# Altium integrated library CMR_Miscellaneous_Devices.IntLib: 110 symbols
Pins are listed as number, name and electrical type; pins without a type are passive.

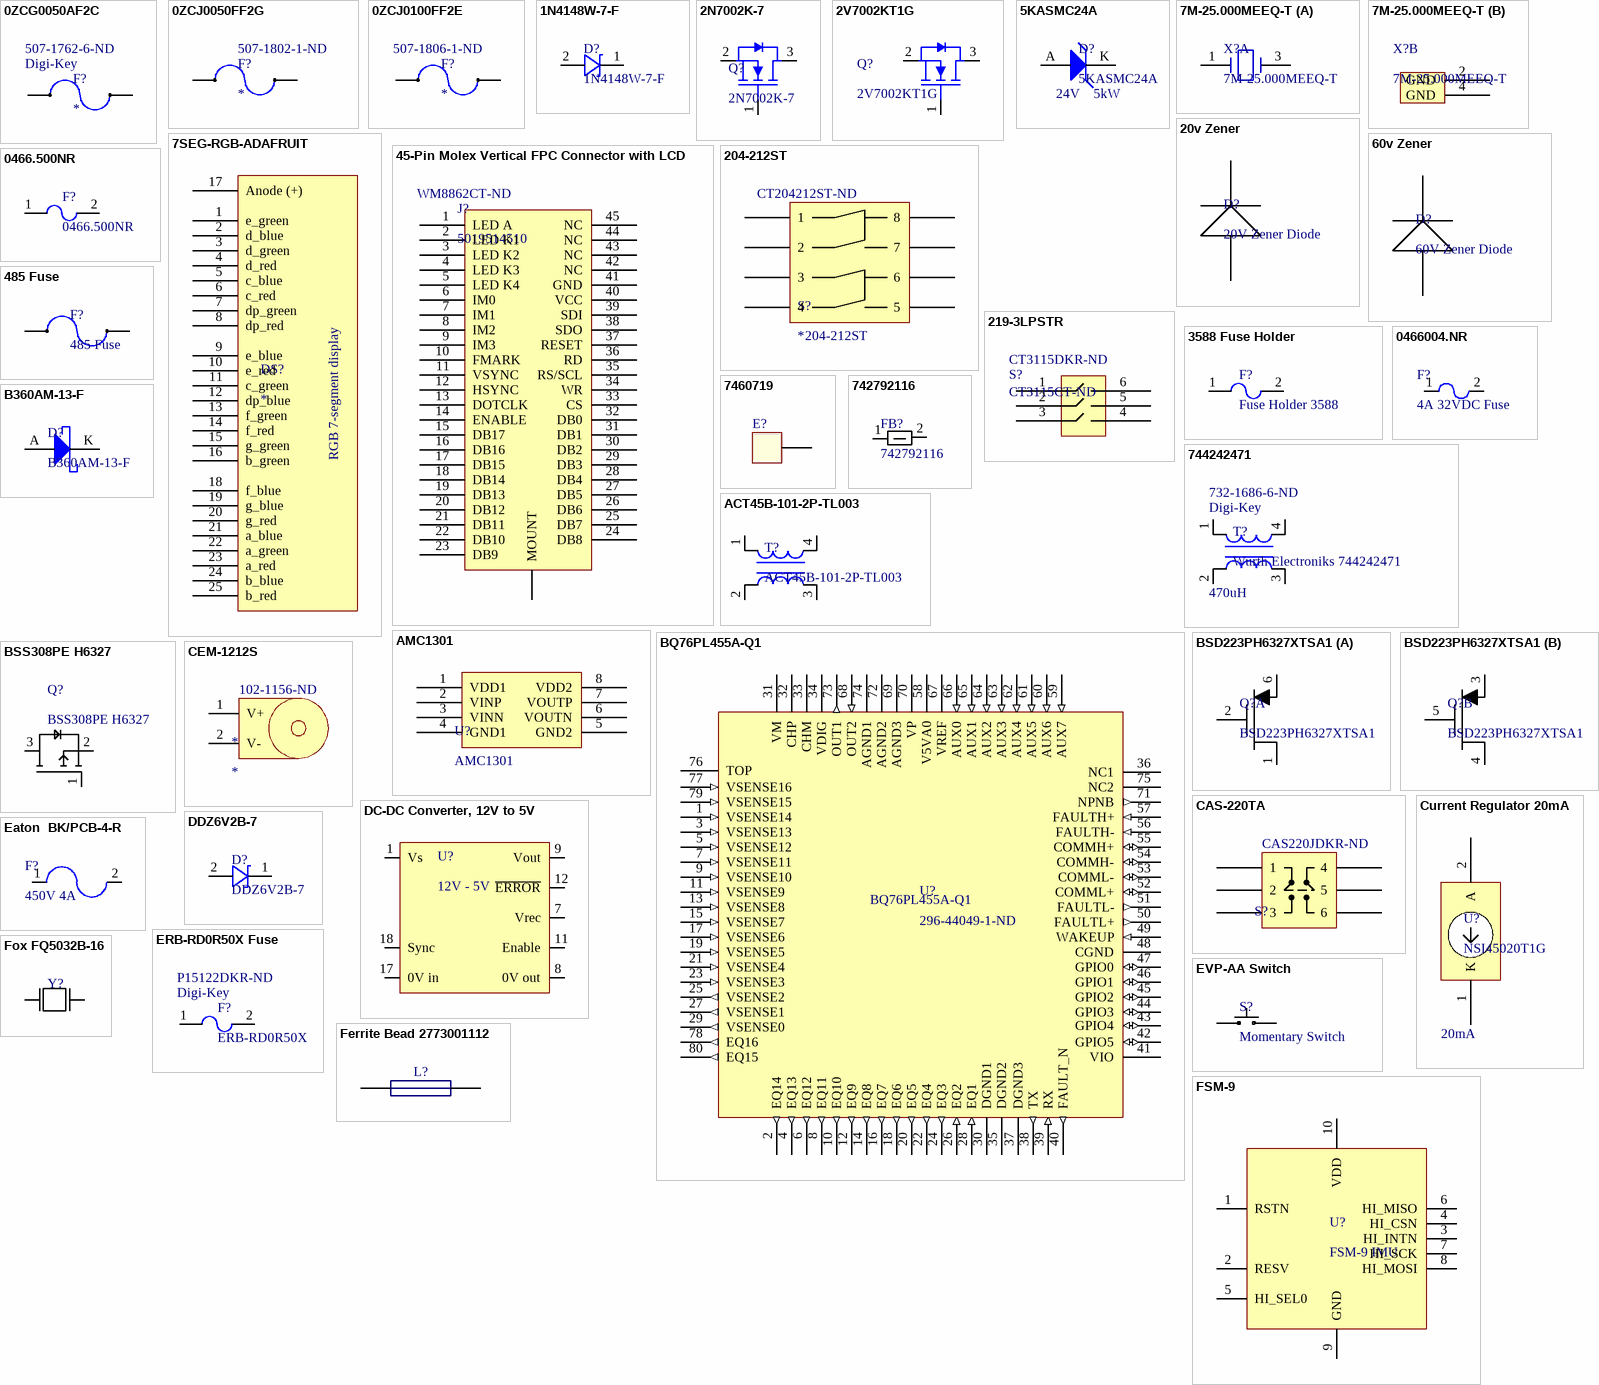
[diagram p0: symbols 0ZCG0050AF2C to FSM-9]

## 0ZCG0050AF2C
designator F?  Supplier 1: Digi-Key  Supplier Part Number 1: 507-1762-6-ND
PTC RESET FUSE 30V 500MA 1812; ComponentLink1Description: Digikey Link; ComponentLink1URL: https://www.digikey.com/product-detail/en/bel-fuse-inc/0ZCG0050AF2C/507-1762-1-ND/4156148
footprint 1812 Resistor Package
pins: 1, 2

## 0ZCJ0050FF2G
designator F?  Supplier Part Number 1: 507-1802-1-ND
PTC RESTTBLE 0.50A 8V CHIP 1206; Supplier 1: Digi-Key
footprint FUSE 3217X06N (PTC Resettable Fuse 8V Ih Surface Mount 1206 (3216 Metric), Concave)
pins: 1, 2

## 0ZCJ0100FF2E
designator F?  Supplier Part Number 1: 507-1806-1-ND
PTC RESTTBLE 1.0A 6V CHIP 1206; Supplier 1: Digi-Key
footprint FUSE 3217X06N (PTC Resettable Fuse 8V Ih Surface Mount 1206 (3216 Metric), Concave)
pins: 1, 2

## 1N4148W-7-F
designator D?
DIODE GEN PURP 100V 300MA SOD123; Supplier: DigiKey; Part Number: 1N4148W-7-F; Supplier Part Number: 1N4148W-FDICT-ND; Datasheet URL: https://www.diodes.com/assets/Datasheets/ds30086.pdf
footprint 1N4148W-7-F
pins: 1 NPNB, 2 NPNB

## 2N7002K-7
designator Q?
MOSFET N-CH 60V 0.38A SOT23-3; Supplier: Digikey; Part Number: 2N7002K-7; Supplier Part Number: 2N7002K-7DICT-ND; Datasheet URL: https://www.diodes.com/assets/Datasheets/ds30896.pdf
footprint 2N7002K-7 (MOSFET N-CH 60V 0.38A SOT23-3)
pins: 1, 2, 3

## 2V7002KT1G
designator Q?
MOSFET N-CH 60V 320MA SOT-23-3; Supplier: DigiKey; Supplier Part Number: 2V7002KT1GOSCT-ND; Part Number: 2V7002KT1G; Datasheet URL: www.mouser.com/ds/2/308/2N7002K-D-40616.pdf
footprint 2V7002KT1G
pins: 1, 2, 3

## 5KASMC24A
designator D?  Power - Peak Pulse: 5kW  Reverse Standoff Voltage: 24V
TVS Diode, Vbr~=28V, 5000W; Supplier 1: Digi-Key; Supplier Part Number 1: 5KASMC24AHM3/57GICT-ND; Datasheet: http://www.vishay.com/docs/89432/5kasmc.pdf
footprint 5KASMC24A
pins: A, K

## 7M-25.000MEEQ-T
designator X?
CRYSTAL 25.0000MHZ 10PF SMD; Manufacturer 1: TXC; Frequency: 25MHz; Frequency Tolerance: 10ppm; ESR (Equivalent Series Resistance): 60R; Supplier 1: Digi-Key; Supplier Part Number 1: 887-1326-1-ND; Manufacturer Part Number 1: 7M-25.000MEEQ-T; Stock 1: 17097; Pricing 1: 1=1.27, 10=1.209, 50=1.1812, 100=1.0125, 500=0.9844, 1000=0.8297 (USD); Mount: Surface Mount; Case/Package: SMD/SMT; Number of Pins: 4; Min Operating Temperature: -20°C; Max Operating Temperature: 70°C; Load Capacitance: 10pF; Packaging: Tape and Reel; Package Quantity: 3000; Tolerance: 10ppm; Frequency Stability: 10ppm; Termination: SMD/SMT; Length: 3.2mm; Height: 0.031inch; Width: 0.098inch; Depth: 2.5mm; REACH SVHC: No SVHC; ComponentLink1URL: https://datasheet.ciiva.com/26918/getdatasheetpartid-757227-26918816.pdf; ComponentLink1Description: https://datasheet.ciiva.com/26918/getdatasheetpartid-757227-26918816.pdf; ComponentLink2URL: https://datasheet.ciiva.com/856/7m-accuracy-856022.pdf; ComponentLink2Description: https://datasheet.ciiva.com/856/7m-accuracy-856022.pdf; ComponentLink3URL: https://datasheet.ciiva.com/22658/1794111-22658486.pdf; ComponentLink3Description: https://datasheet.ciiva.com/22658/1794111-22658486.pdf; ComponentLink4URL: https://datasheet.ciiva.com/856/7m-accuracy-856023.pdf; ComponentLink4Description: https://datasheet.ciiva.com/856/7m-accuracy-856023.pdf; ComponentLink5URL: https://datasheet.ciiva.com/856/7m-accuracy-856024.pdf; ComponentLink5Description: https://datasheet.ciiva.com/856/7m-accuracy-856024.pdf; ComponentLink6URL: https://datasheet.ciiva.com/4946/7m-11184-4946126.pdf; ComponentLink6Description: https://datasheet.ciiva.com/4946/7m-11184-4946126.pdf; ComponentLink7URL: https://datasheet.ciiva.com/28498/1794111-28498878.pdf; ComponentLink7Description: https://datasheet.ciiva.com/28498/1794111-28498878.pdf
footprint OSCSC320X250X100N
part A pins: 1 11, 3
part B pins: 2 GND, 4 GND

## 7SEG-RGB-ADAFRUIT
designator DS?
footprint 7SEG-RGB-ADAFRUIT
pins: 1 e_green, 2 d_blue, 3 d_green, 4 d_red, 5 c_blue, 6 c_red, 7 dp_green, 8 dp_red, 9 e_blue, 10 e_red, 11 c_green, 12 dp_blue, 13 f_green, 14 f_red, 15 g_green, 16 b_green, 17 Anode (+), 18 f_blue, 19 g_blue, 20 g_red, 21 a_blue, 22 a_green, 23 a_red, 24 b_blue, 25 b_red
text: RGB 7-segment display

## 20v Zener
designator D?, comment 20V Zener Diode
footprint UDZS20B (20v Zener)
pins: 1, 2

## 45-Pin Molex Vertical FPC Connector with LCD
designator J?, comment 5019514510  Supplier Part Number 1: WM8862CT-ND
45 pin Molex, 0.50mm pitch, with LCD Display; Manufacturer Part Number: 0541044531; LCD Manufacturer: Displaytech; LCD Manufacturer Part Number: DT028ATFT; Manufacturer: Molex; Datasheet: http://www.molex.com/pdm_docs/sd/541044631_sd.pdf; LCD Datasheet: http://www.mouser.com/ds/2/116/DT028ATFT-v21-221378.pdf; Supplier 1: Digi-Key
footprint LCD Display with FPC Connector (2.8" Displaytech DT028ATFT LCD Display with Molex 0541044531 Right Angle 45-pin FPC Connector)
pins: 0 MOUNT, 1 LED A, 2 LED K1, 3 LED K2, 4 LED K3, 5 LED K4, 6 IM0, 7 IM1, 8 IM2, 9 IM3, 10 FMARK, 11 VSYNC, 12 HSYNC, 13 DOTCLK, 14 ENABLE, 15 DB17, 16 DB16, 17 DB15, 18 DB14, 19 DB13, 20 DB12, 21 DB11, 22 DB10, 23 DB9, 24 DB8, 25 DB7, 26 DB6, 27 DB5, 28 DB4, 29 DB3, 30 DB2, 31 DB1, 32 DB0, 33 CS, 34 WR, 35 RS/SCL, 36 RD, 37 RESET, 38 SDO, 39 SDI, 40 VCC, 41 GND, 42 NC, 43 NC, 44 NC, 45 NC

## 60v Zener
designator D?, comment 60V Zener Diode
footprint MMSZ5264BT1G (60v Zener)
pins: 1, 2

## 204-212ST
designator S?  Supplier Part Number 1: CT204212ST-ND
SWITCH SLIDE DIP DPST 50MA 24V; Supplier 1: Digi-Key
footprint 204-212ST  2 POS DPST (Dip Switch DPST 2 Position Surface Mount Slide (Standard) Actuator 50mA 24VDC)
pins: 1, 2, 3, 4, 5, 6, 7, 8

## 219-3LPSTR
designator S?, comment CT3115CT-ND  Supplier Part Number 1: CT3115DKR-ND
SWITCH SLIDE DIP SPST 100MA 20V; Supplier 1: Digi-Key
footprint 219-3LPSTR (SWITCH SLIDE DIP SPST 100MA 20V)
pins: 1, 2, 3, 4, 5, 6

## 0466.500NR
designator F?
FUSE BOARD MOUNT 500MA 63VAC/VDC; Supplier: DigiKey; Part Number: 0466.500NR; Supplier Part Number: F1454CT-ND; Datasheet URL: http://www.littelfuse.com/~/media/electronics/datasheets/fuses/littelfuse_fuse_466_datasheet.pdf.pdf
footprint 0466.500NR (, 2-Leads, Body 3.18x1.52mm, IPC Medium Density)
pins: 1, 2

## 485 Fuse
designator F?
485 Series Fast-Blow Fuse; Part Number: 0485001.DR; Voltage Rating: 600V; Current Rating: 1A; Datasheet: http://www.littelfuse.com/~/media/electronics/datasheets/fuses/littelfuse_fuse_485_datasheet.pdf.pdf; Package: 2-SMD
footprint 485 Fuse (485 Series Fast-Blow Fuse)
pins: 1, 2

## 3588 Fuse Holder
designator F?, comment Fuse Holder 3588
Keystone Electronics 3588; Supplier 1: Digi-Key; Supplier Part Number 1: 36-3588-ND; Datasheet: http://keyelco.com/userAssets/file/M65p43.pdf
footprint Fuse Holder 3588 (Keystone Electronics 3588 Automotive Blade Fuse Holder, SMT)
pins: 1, 2

## 0466004.NR
designator F?, comment 4A 32VDC Fuse
FUSE BOARD MNT 4A 32VAC/VDC 1206; ComponentLink1Description: Digikey; ComponentLink1URL: https://www.digikey.com/product-detail/en/littelfuse-inc/0466004.NR/F1459CT-ND/521357
footprint CAF-127P152X317-2N (Chip Array, Flat, 2-Leads, Pitch 1.27mm,  Body 1.52x3.18mm,  IPC Medium Density)
pins: 1, 2

## 7460719
designator E?
REDCUBE PRESS-FIT with external thread, full plain WP-SHFU, M8, 13 mm; Part Number: 7460719; Pin Number: 25; Rated Current: 250 A; Thread Length: 13 mm; ComponentLink1Description: Manufacturer; ComponentLink1URL: http://www.we-online.de; ComponentLink2Description: Datasheet; ComponentLink2URL: http://katalog.we-online.de/em/datasheet/7460719.pdf; Published Date: Feb. 2017; Publisher: Wurth Elektronik; Thread: M8
footprint 7460719 (M8, thread 13mm)
pins: 1

## 742792116
designator FB?
FERRITE BEAD 500 OHM 1206 1LN; Datasheet URL: media.digikey.com/PDF/Data Sheets/Wurth Electronics PDFs/742792116.pdf; Supplier: DigiKey; Supplier Part Number: 732-4652-1-ND; Part Number: 742792116
footprint 742792116 (, 2-Leads, Body 3.20x1.60mm, IPC Medium Density)
pins: 1, 2

## 744242471
designator T?, comment Wurth Electroniks 744242471  Inductance: 470uH  Supplier 1: Digi-Key  Supplier Part Number 1: 732-1686-6-ND
470µH @ 100kHz 2 Line Common Mode Choke Surface Mount 2.2 kOhms @ 15MHz 400mA DCR 350 mOhm; ComponentLink1Description: Digikey Link; ComponentLink1URL: https://www.digikey.com/product-detail/en/wurth-electronics-inc/744242471/732-1686-1-ND/1994266; ComponentLink2Description: Datasheet Link; ComponentLink2URL: https://katalog.we-online.de/pbs/datasheet/744242471.pdf
footprint Wurth 744242471
pins: 1, 2, 3, 4

## ACT45B-101-2P-TL003
designator T?
Common Mode Chokes / Filters 5000ohms 100uH 150mA CAN-BUS AEC-Q200; Supplier: DigiKey; Supplier Part Number: 445-3959-1-ND; Part Number: ACT45B-101-2P-TL003; Datasheet URL: www.mouser.com/ds/2/400/e9711_act-469477.pdf
footprint ACT45B-101-2P-TL003 (DFN, 4-Leads, Body 3.20x4.50mm, Pitch 4.55mm, IPC Medium Density)
pins: 1, 2, 3, 4

## AMC1301
designator U?
IC AMP ISOLATION 250MV 8SOIC; Supplier 1: Digi-Key; Supplier Part Number 1: 296-44577-2-ND
footprint SOIC127P1150X280-8N (SOIC, 8-Leads, Body 5.85x7.50mm, Pitch 1.27mm, IPC Medium Density)
pins: 1 VDD1, 2 VINP, 3 VINN, 4 GND1, 5 GND2, 6 VOUTN, 7 VOUTP, 8 VDD2

## B360AM-13-F
designator D?
Schottky Diode B360AM-13-F; Datasheet: http://diodes.com/_files/datasheets/B360AM.pdf; Supplier 1: Digi-Key; Supplier Part Number 1: B360AM-13-FDICT-ND
footprint B360AM-13-F
pins: A, K

## BQ76PL455A-Q1
designator U?, comment 296-44049-1-ND
IC BATT MONITOR/PROTECT 80TQFP; Part Number: BQ76PL455ATPFCRQ1; Supplier: DigiKey; Datasheet URL: http://www.ti.com/lit/ds/symlink/bq76pl455a-q1.pdf; Design Recommendations: http://www.ti.com/lit/an/slua791/slua791.pdf; Supplier Part Number: 6-44049-1-ND
footprint BQ76PL455A-Q1 (TSQFP, 80-Leads, Body 12.00x12.00mm, Pitch 0.50mm, IPC Medium Density)
pins: 1 VSENSE14 (in), 2 EQ14 (out), 3 VSENSE13 (in), 4 EQ13 (out), 5 VSENSE12 (in), 6 EQ12 (out), 7 VSENSE11 (in), 8 EQ11 (out), 9 VSENSE10 (in), 10 EQ10 (out), 11 VSENSE9 (in), 12 EQ9 (out), 13 VSENSE8 (in), 14 EQ8 (out), 15 VSENSE7 (in), 16 EQ7 (out), 17 VSENSE6 (in), 18 EQ6 (out), 19 VSENSE5 (in), 20 EQ5 (out), 21 VSENSE4 (in), 22 EQ4 (out), 23 VSENSE3 (in), 24 EQ3 (out), 25 VSENSE2 (out), 26 EQ2 (in), 27 VSENSE1 (out), 28 EQ1 (in), 29 VSENSE0 (out), 30 DGND1 (power), 31 VM (power), 32 CHP (power), 33 CHM (power), 34 VDIG (power), 35 DGND2 (power), 36 NC1, 37 DGND3 (power), 38 TX (out), 39 RX (in), 40 FAULT_N (out), 41 VIO (power), 42 GPIO5 (io), 43 GPIO4 (io), 44 GPIO3 (io), 45 GPIO2 (io), 46 GPIO1 (io), 47 GPIO0 (io), 48 CGND (power), 49 WAKEUP (in), 50 FAULTL+ (out), 51 FAULTL- (out), 52 COMML+ (io), 53 COMML- (io), 54 COMMH- (io), 55 COMMH+ (io), 56 FAULTH- (in), 57 FAULTH+ (in), 58 V5VA0 (power), 59 AUX7 (in), 60 AUX6 (in), 61 AUX5 (in), 62 AUX4 (in), 63 AUX3 (in), 64 AUX2 (in), 65 AUX1 (in), 66 AUX0 (in), 67 VREF (power), 68 OUT2 (in), 69 AGND3 (power), 70 VP (power), 71 NPNB (out), 72 AGND2 (power), 73 OUT1 (out), 74 AGND1 (power), 75 NC2, 76 TOP (power), 77 VSENSE16 (in), 78 EQ16 (out), 79 VSENSE15 (in), 80 EQ15 (out)

## BSD223PH6327XTSA1
designator Q?
dual p-channel mosfet; Manufacturer 1: Infineon; Drain to Source Voltage (Vdss): -20V; Continuous Drain Current (ID): 390mA; Rds On Max: 1.2R; Input Capacitance: 56pF; Max Power Dissipation: 250mW; Turn-On Delay Time: 3.8ns; Rise Time: 5ns; Turn-Off Delay Time: 5.1ns; Gate to Source Voltage (Vgs): 12V; Supplier 1: Digi-Key; Supplier Part Number 1: BSD223PH6327XTSA1CT-ND; Manufacturer Part Number 1: BSD223PH6327XTSA1; Stock 1: 77806; Pricing 1: 1=0.56, 10=0.398, 100=0.2615, 500=0.1545, 1000=0.1189 (USD); Mount: Surface Mount; Case/Package: SOT-363; Number of Pins: 6; Min Operating Temperature: -55°C; Max Operating Temperature: 150°C; Packaging: Tape and Reel; Drain to Source Resistance: 1.2R; Max Dual Supply Voltage: -20V; Length: 2mm; Height: 0.8mm; Width: 1.25mm; Lead Free: Lead Free; Halogen Free: Halogen Free; ComponentLink1URL: http://www.farnell.com/datasheets/2211530.pdf; ComponentLink1Description: http://www.farnell.com/datasheets/2211530.pdf; ComponentLink2URL: http://components.arrow.com/part/dataview/53770121S151981N2051; ComponentLink2Description: http://components.arrow.com/part/dataview/53770121S151981N2051; ComponentLink3URL: https://www.infineon.com/dgdl/BSD223P_Rev1.5.pdf?folderId=db3a304314dca38901154a72e3951a65&fileId=db3a30433580b37101358619d0af33b9; ComponentLink3Description: https://www.infineon.com/dgdl/BSD223P_Rev1.5.pdf?folderId=db3a304314dca38901154a72e3951a65&fileId=db3a30433580b37101358619d0af33b9; ComponentLink4URL: http://www.infineon.com/dgdl/Infineon-BSD223P-DS-v01_06-EN.pdf?fileId=5546d4624b0b249c014b3607ad2610c8; ComponentLink4Description: http://www.infineon.com/dgdl/Infineon-BSD223P-DS-v01_06-EN.pdf?fileId=5546d4624b0b249c014b3607ad2610c8; ComponentLink5URL: http://www.infineon.com/dgdl/BSD223P_Rev1.5.pdf?folderId=db3a304314dca38901154a72e3951a65&fileId=db3a30433580b37101358619d0af33b9; ComponentLink5Description: http://www.infineon.com/dgdl/BSD223P_Rev1.5.pdf?folderId=db3a304314dca38901154a72e3951a65&fileId=db3a30433580b37101358619d0af33b9
footprint PG-SOT-363 (SOT23, 6-Leads, Body 2.00x2.15mm, Pitch 0.65mm, IPC Medium Density)
part A pins: 1, 2, 6
part B pins: 3, 4, 5

## BSS308PE H6327
designator Q?
MOSFET P-Ch -30V -2A SOT-23-3; Supplier: Mouser; Part Number: BSS308PE H6327; Supplier Part Number: 726-BSS308PEH6327; Datasheet URL: http://www.mouser.com/ds/2/196/BSS308PE_Rev2.03_-88579.pdf
pins: 1, 2, 3

## CAS-220TA
designator S?  Supplier Part Number 1: CAS220JDKR-ND  (hidden comment: *)
SWITCH SLIDE DPDT 100MA 6V; Supplier 1: Digi-Key
footprint CAS-220
pins: 1, 2, 3, 4, 5, 6

## CEM-1212S
designator *  Supplier Part Number 1: 102-1156-ND
AUDIO MAGNETIC XDCR 6-16V TH; Manufacturer: CUI Inc.; Manufacturer Part Number: CEM-1212S; Driver Circuitry: Transducer, Externally Driven; Input Type: Zero-Peak Signal; Voltage - Rated: 12V; Voltage Range: 6 ~ 16V; Frequency: 2.4kHz; Operating Mode: Single Tone; Sound Pressure Level: 85dB @ 12V, 10cm; Current - Supply: 40mA; Port Location: Top; Ratings: Washable; Supplier 1: Digi-Key; RoHS: RoHS Compliant; Category: Audio Products; Stock 1: 21467; Pricing 1: 1=1.31, 10=1.018, 100=0.7763, 500=0.621, 1000=0.552, 2500=0.45885 (USD); Packaging: Bulk; Part Status: Active; Technology: Magnetic; Duration: -; Operating Temperature: -20°C ~ 60°C; Approvals: -; Mounting Type: Through Hole; Termination: PC Pins; Size / Dimension: 12.0mm Dia x 10.0mm H; Height - Seated (Max): *; ComponentLink1URL: http://www.cui.com/product/resource/digikeypdf/cem-1212s.pdf; ComponentLink1Description: http://www.cui.com/product/resource/digikeypdf/cem-1212s.pdf
footprint CEM-1212S
pins: 1 V+, 2 V-

## Current Regulator 20mA
designator U?, comment NSI45020T1G  Current: 20mA
20mA Current regulator SOD-123. 208mW; Manufacturer: ON Semiconductor; Supplier 1: Digi-Key; Supplier Part Number 1: NSI45020T1GOSTR-ND; Manufacturer Part Number: NSI45020T1G; Datasheet: http://www.onsemi.com/pub_link/Collateral/NSI45020-D.PDF
footprint NSI45020 (SOD-123 Package Constant Current Regulator, 20mA)
pins: 1 K, 2 A

## DC-DC Converter, 12V to 5V
designator U?, comment 12V - 5V
DigiKey 296-9458-5-ND
footprint NVE (R-PDIP-T10/18)
pins: 1 Vs, 7 Vrec, 8 0V out, 9 Vout, 11 Enable, 12 ~{ERROR}, 17 0V in, 18 Sync

## DDZ6V2B-7
designator D?
DIODE ZENER 6.2V 500MW SOD123; Supplier: DigiKey; Part Number: DDZ6V2B-7; Datasheet URL: https://www.diodes.com/assets/Datasheets/ds30407.pdf; Supplier Part Number: DDZ6V2BDICT-ND
footprint DDZ6V2B-7
pins: 1 NPNB, 2 NPNB

## Eaton  BK/PCB-4-R
designator F?, comment 450V 4A
450V 4A 2.5kA Breaking; ComponentLink1Description: digikey; ComponentLink1URL: https://www.digikey.com/product-detail/en/littelfuse-inc/0456040.DR/F3364CT-ND/2080265
footprint BK/PCB-4-R
pins: 1, 2

## ERB-RD0R50X Fuse
designator F?, comment ERB-RD0R50X  Supplier 1: Digi-Key  Supplier Part Number 1: P15122DKR-ND
FUSE BOARD MNT 500MA 32VDC 0402; ComponentLink1Description: Digikey Link; ComponentLink1URL: https://www.digikey.com/product-detail/en/panasonic-electronic-components/ERB-RD0R50X/P15122CT-ND/2796798; ComponentLink2Description: Datasheet Link; ComponentLink2URL: https://industrial.panasonic.com/cdbs/www-data/pdf/AFA0000/AFA0000C7.pdf
footprint 0402 Fuse
pins: 1, 2

## EVP-AA Switch
designator S?, comment Momentary Switch
EVP-AA Momentary Switch SPST-NO; Part Number: EVP-AA202K; Supplier 1: Digi-Key; Supplier Part Number 1: P13348SCT-ND; Datasheet: http://industrial.panasonic.com/lecs/www-data/pdf/ATK0000/ATK0000CE26.pdf
footprint EVP-AA202K (Momentary Switch SMT SPST-NO EVP-AA series)
pins: 1, 2

## Ferrite Bead 2773001112
designator L?  (value not drawn)
73 Material Fair-rite ferrite bead; Part #: 2773001112; Manufacturer: Fair-rite
footprint Fair-rite 2773001112 (2773001112 Ferrite Bead)
pins: 1, 2

## Fox FQ5032B-16
designator Y?
16MHz Crystal
footprint FQ 5032B
pins: 1, 3

## FSM-9
designator U?, comment FSM-9 IMU
Hillcrest Labs FSM-9 9-axis IMU and AHRS; Supplier 1: Hillcrest Labs; Supplier Part Number 1: FSM-9; Datasheet: http://hillcrestlabs.com/download/2416/; Created By: semerson
footprint FSM-9 (Hillcrest Labs FSM-9 9-axis IMU/AHRS)
pins: 1 RSTN, 2 RESV, 3 HI_INTN, 4 HI_CSN, 5 HI_SEL0, 6 HI_MISO, 7 HI_SCK, 8 HI_MOSI, 9 GND, 10 VDD

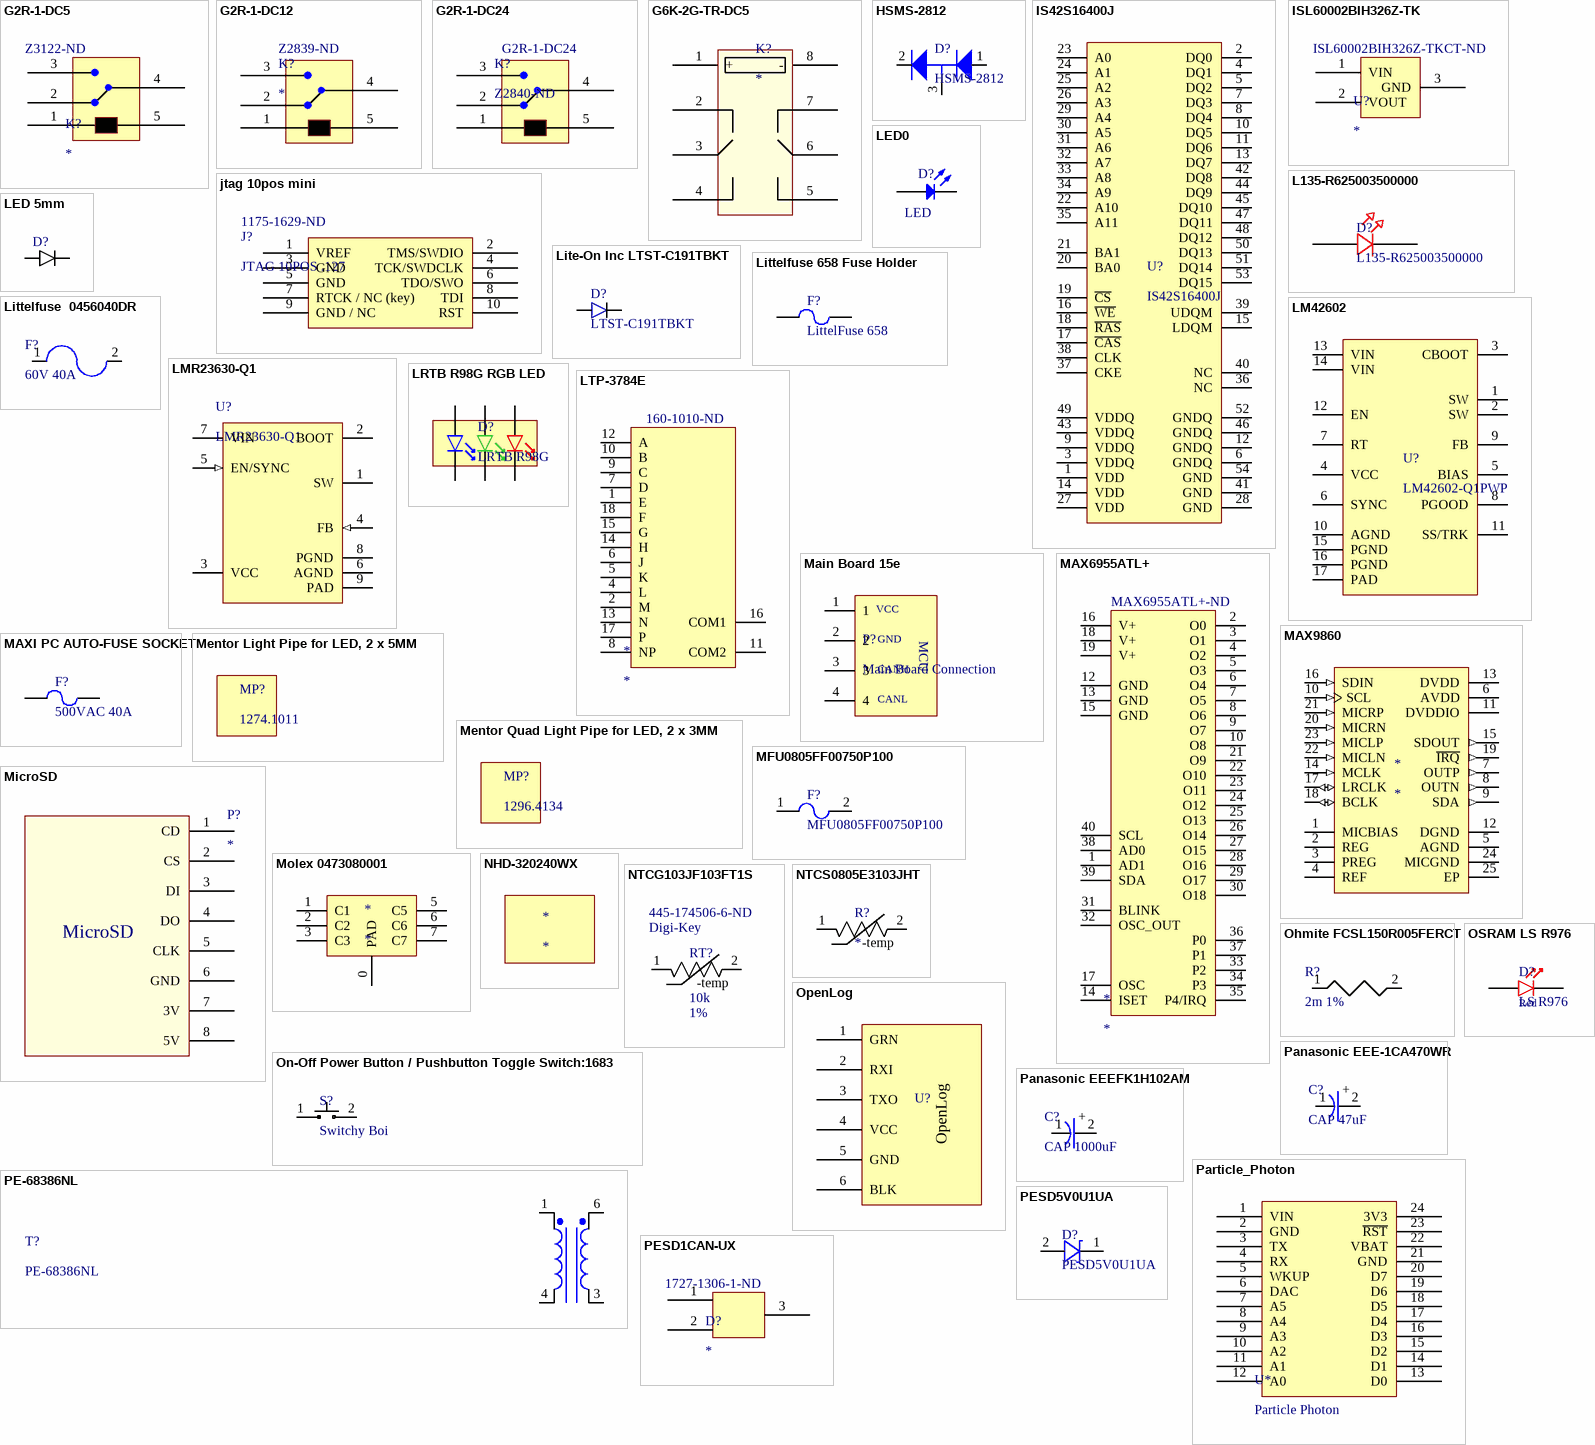
[diagram p1: symbols G2R-1-DC5 to PESD5V0U1UA]

## G2R-1-DC5
designator K?  Supplier Part Number 1: Z3122-ND
RELAY GEN PURPOSE SPDT 10A 5V; Supplier 1: Digi-Key
footprint G2R-1 (G2R-1 RELAY GEN PURPOSE SPDT)
pins: 1 18, 2 21, 3 20, 4 19, 5 22

## G2R-1-DC12
designator K?  Supplier Part Number 1: Z2839-ND
RELAY GEN PURPOSE SPDT 10A 12V; Value: Value; Type: Type; RefDes: RefDes; Supplier 1: Digi-Key
footprint G2R-1 (G2R-1 RELAY GEN PURPOSE SPDT)
pins: 1 18, 2 21, 3 20, 4 19, 5 22

## G2R-1-DC24
designator K?, comment Z2840-ND
RELAY GEN PURPOSE SPDT 10A 24V; RefDes: RefDes; Supplier Part Number 1: Z2840-ND; Supplier 1: Digi-Key; Type: Type; Value: Value
footprint G2R-1 (G2R-1 RELAY GEN PURPOSE SPDT)
pins: 1 18, 2 21, 3 20, 4 19, 5 22

## G6K-2G-TR-DC5
designator K?
MPN: G6K-2G-TR DC5
footprint G6K-2G
pins: 1 +, 2 NO1, 3 OUT1, 4 NC1, 5 NC2, 6 OUT2, 7 NO2, 8 -

## HSMS-2812
designator D?
Schottky Diodes & Rectifiers 20 VBR 1.2 pF; Part Number: HSMS-2812-BLKG; Supplier: Mouser; Datasheet: http://www1.futureelectronics.com/doc/AVAGO%20TECHNOLOGIES/HSMS-2812-TR1G.pdf; Supplier Part Number: 630-HSMS-2812-BLKG
footprint SOT23-HSMS-2812 (SOT23, 3-Leads, Body 2.93x2.40mm, Pitch 0.95mm, IPC Medium Density)
pins: 1, 2, 3

## IS42S16400J
designator U?
64Mbit SDRAM; Manufacturer: ISSI; Datasheet: http://www.mouser.com/ds/2/198/42-45S16400J-258565.pdf; Manufacturer Part Number: IS42S16400J; Supplier 1: Mouser; Supplier Part Number 1: 870-IS42S16400J-7TL
footprint IS42S16400J (64Mbit SDRAM)
pins: 1 VDD, 2 DQ0, 3 VDDQ, 4 DQ1, 5 DQ2, 6 GNDQ, 7 DQ3, 8 DQ4, 9 VDDQ, 10 DQ5, 11 DQ6, 12 GNDQ, 13 DQ7, 14 VDD, 15 LDQM, 16 ~{WE}, 17 ~{CAS}, 18 ~{RAS}, 19 ~{CS}, 20 BA0, 21 BA1, 22 A10, 23 A0, 24 A1, 25 A2, 26 A3, 27 VDD, 28 GND, 29 A4, 30 A5, 31 A6, 32 A7, 33 A8, 34 A9, 35 A11, 36 NC, 37 CKE, 38 CLK, 39 UDQM, 40 NC, 41 GND, 42 DQ8, 43 VDDQ, 44 DQ9, 45 DQ10, 46 GNDQ, 47 DQ11, 48 DQ12, 49 VDDQ, 50 DQ13, 51 DQ14, 52 GNDQ, 53 DQ15, 54 GND

## ISL60002BIH326Z-TK
designator U?  Supplier Part Number 1: ISL60002BIH326Z-TKCT-ND
IC VREF SERIES 2.6V SOT23-3; Supplier 1: Digi-Key
footprint SOT23-HSMS-2812 (SOT23, 3-Leads, Body 2.93x2.40mm, Pitch 0.95mm, IPC Medium Density)
pins: 1 VIN, 2 VOUT, 3 GND

## jtag 10pos mini
designator J?, comment JTAG 10POS .127  Supplier Part Number 1: 1175-1629-ND
Supplier 1: Digi-Key
footprint 5x2 JTAG SMD
pins: 1 VREF, 2 TMS/SWDIO, 3 GND, 4 TCK/SWDCLK, 5 GND, 6 TDO/SWO, 7 RTCK / NC (key), 8 TDI, 9 GND / NC, 10 RST

## L135-R625003500000
designator D?
LED Lighting Color LUXEON 3535L Red 625nm (620nm ~ 630nm) 2-SMD, Flat Lead; Part Number: L135-R625003500000; Supplier 1: Digi-Key; Supplier Part Number 1: 1416-1493-1-ND; Datasheet: http://www.lumileds.com/uploads/565/DS146-pdf; Manufacturer: Luxeon
footprint L135-R625003500000 (LUXEON 3535L Color Line)
pins: 1, 2

## LED0
designator D?, comment LED
Manufacturer: Lite-On Inc; Manufacturer Part Number: LTST-C171AKT; Color: Red; Wavelength - Dominant: 631nm; Wavelength - Peak: 639nm; Millicandela Rating: 54mcd; Voltage - Forward (Vf) (Typ): 2V; Current - Test: 20mA; Viewing Angle: 130°; Lens Type: Clear; Lens Style/Size: Rectangle with Flat Top, 1.4mm x 1.25mm; Published: 8-Jun-2000; LatestRevisionDate: 08-Jul-2005; LatestRevisionNote: Mech Layer 1 removed.; PackageReference: LED-0; Publisher: Altium Limited; PackageDescription: LED; 2 Leads; Supplier 1: Digi-Key; Supplier Part Number 1: 160-1419-1-ND; RoHS: RoHS Compliant; Category: Optoelectronics; Stock 1: 72989; Pricing 1: 1=0.32, 10=0.248, 100=0.135, 250=0.09, 500=0.0765, 1000=0.0585 (USD); Packaging: Cut Tape (CT); Package / Case: 0805 (2012 Metric); Size / Dimension: 2.00mm L x 1.25mm W; Height: 0.80mm; Mounting Type: Surface Mount; Luminous Flux @ Current - Test: -; ComponentLink1URL: http://optoelectronics.liteon.com/upload/download/DS22-2000-109/S_110_LTST-C171KRKT.pdf; ComponentLink1Description: http://optoelectronics.liteon.com/upload/download/DS22-2000-109/S_110_LTST-C171KRKT.pdf
footprint LED-0 (LED; 2 Leads)
simulation model LED0 (Diode)
footprint 0402 LED (0402 LED Package)
footprint 0603 - LED
footprint LED_0805 (Liteon 0805 Chip LED)
footprint 1206 LED
pins: 1 K, 2 A

## LED 5mm
designator D?
footprint LED 5mm
pins: 1, 2

## Lite-On Inc LTST-C191TBKT
designator D?, comment LTST-C191TBKT
LED 468NM BLUE CLEAR 0603 SMD; Vf @ 20mA: 3.4V (typ); Derated Current: 5 mA; Color: Blue; PN: LTST-C191TBKT
footprint Lite-On Inc LTST-C191TBKT (LED 468NM BLUE CLEAR 0603 SMD)
pins: 0, 1

## Littelfuse 658 Fuse Holder
designator F?, comment LittelFuse 658
LittelFuse 658 Series Fuse Holder; Rated Current: 10A; Rated Voltage: 250; Contact Resistance: 5mOhm; Rated Power: 4W (with 660 or no cover); Datasheet: http://www.littelfuse.com/data/en/data_sheets/658_659_660_lf_050519.pdf
footprint LittelFuse 658 Series Fuse Holder (Fuse Holder)
pins: 1, 2

## Littelfuse  0456040DR
designator F?, comment 60V 40A
60V 40A 600A Breaking; ComponentLink1Description: digikey; ComponentLink1URL: https://www.digikey.com/product-detail/en/littelfuse-inc/0456040.DR/F3364CT-ND/2080265
footprint 0456040DR
pins: 1, 2

## LM42602
designator U?, comment LM42602-Q1PWP
Simple Switcher 3.5V to 36V 2A Synchronous Step-Down Voltage Converter; Manufacturer: Texas Instruments; Manufacturer Part Number: LM43602-Q1; Datasheet: http://www.ti.com/lit/ds/symlink/lm43602-q1.pdf; Input Voltage Range: 3.5V to 36V; Output Current: 2A; Supplier 1: Digi-Key; Supplier Part Number 1: 296-42119-1-ND
footprint LM43602-Q1 (SIMPLE SWITCHER 3.5V TO 36V INPUT 2A OUTPUT)
pins: 1 SW, 2 SW, 3 CBOOT, 4 VCC, 5 BIAS, 6 SYNC, 7 RT, 8 PGOOD, 9 FB, 10 AGND, 11 SS/TRK, 12 EN, 13 VIN, 14 VIN, 15 PGND "SW", 16 PGND, 17 PAD
